# Altium schematic symbol library TI Power Management Shunt Voltage Reference.SchLib: 1526 symbols (part 7 of 18) (continued)
## REF1004C-2.5E4
designator U?
Micropower Voltage Reference, 2.5 V, 20 ppm / degC, 20 mA, 0 to 70 degC, 8-pin SOIC (D), Green (RoHS & no Sb/Br); Manufacturer: Texas Instruments; PartNumber: REF1004C-2.5E4; Iout/Iz(Max)(mA): 20; Rating: Catalog; SubFamily: Shunt Voltage Reference; VO(V): 2.5; DatasheetVersion: SBVS002; PackageVersion: 4040047-3/M; PackageReference: D8; PackageDescription: 8-Pin Plastic Small Outline, Body 4.9 x 3.9 mm, Pitch 1.27 mm; Supplier 1: Digi-Key; Supplier Part Number 1: REF1004C-2.5E4-ND; Supplier 2: Newark; Supplier Part Number 2: 28M6737; Supplier 3: Mouser; Supplier Part Number 3: 595-REF1004C-2.5E4; Eco-Plan: Green (RoHS & no Sb/Br); Min Iz for Regulation(uA): 20; Temp Coeff(Typ)(ppm/ degree C): 20; Mounting Technology: Surface Mount; Code_JEDEC: MS-012; ComponentLink1Description: Manufacturer URL; ComponentLink1URL: http://www.ti.com/; ComponentLink2Description: Datasheet; ComponentLink2URL: http://www.ti.com/lit/ds/symlink/ref1004-2.5.pdf; ComponentLink3Description: Package Specification; ComponentLink3URL: http://www.ti.com/litv/pdf/msoi002j; ComponentLink4Description: URL Link1; ComponentLink4URL: Samples URL:http://www.ti.com/product/ref1004-2.5
footprint TI-D8_N (SOIC, 8-Leads, Body 4.9x3.9mm, Pitch 1.27mm, IPC Medium Density)
part A pins: 4 ANAODE, 6 CATHODE, 8 CATHODE
part B pins: 1 NC, 2 NC, 3 NC, 5 NC, 7 NC

## REF1004I-1.2
designator U?
Micropower Voltage Reference, 1.235 V, 20 ppm / degC, 20 mA, -40 to 85 degC, 8-pin SOIC (D), Green (RoHS & no Sb/Br); Manufacturer: Texas Instruments; PartNumber: REF1004I-1.2; Initial Accuracy @ 25/deg C(%): 0.3; Iout/Iz(Max)(mA): 20; Min Iz for Regulation(uA): 10; Rating: Catalog; SubFamily: Shunt Voltage Reference; VO(V): 1.235; DatasheetVersion: SBVS002; PackageVersion: 4040047-3/M; PackageReference: D8; PackageDescription: 8-Pin Plastic Small Outline, Body 4.9 x 3.9 mm, Pitch 1.27 mm; Supplier 1: Digi-Key; Supplier Part Number 1: REF1004I-1.2-ND; Supplier 2: Newark; Supplier Part Number 2: 75C7403; Supplier 3: Mouser; Supplier Part Number 3: 595-REF1004I-1.2; Eco-Plan: Green (RoHS & no Sb/Br); Temp Coeff(Typ)(ppm/ degree C): 20; Mounting Technology: Surface Mount; Code_JEDEC: MS-012; ComponentLink1Description: Manufacturer URL; ComponentLink1URL: http://www.ti.com/; ComponentLink2Description: Datasheet; ComponentLink2URL: http://www.ti.com/general/docs/lit/getliterature.tsp?genericPartNumber=REF1004-1.2&fileType=pdf; ComponentLink3Description: Package Specification; ComponentLink3URL: http://www.ti.com/litv/pdf/msoi002j
footprint TI-D8_N (SOIC, 8-Leads, Body 4.9x3.9mm, Pitch 1.27mm, IPC Medium Density)
part A pins: 4 ANODE, 6 CATHODE, 8 CATHODE
part B pins: 1 NC, 2 NC, 3 NC, 5 NC, 7 NC

## REF1004I-1.2/2K5
designator U?
Micropower Voltage Reference, 1.235 V, 20 ppm / degC, 20 mA, -40 to 85 degC, 8-pin SOIC (D), Green (RoHS & no Sb/Br); Manufacturer: Texas Instruments; PartNumber: REF1004I-1.2/2K5; Initial Accuracy @ 25/deg C(%): 0.3; Iout/Iz(Max)(mA): 20; Min Iz for Regulation(uA): 10; Rating: Catalog; SubFamily: Shunt Voltage Reference; VO(V): 1.235; DatasheetVersion: SBVS002; PackageVersion: 4040047-3/M; PackageReference: D8; PackageDescription: 8-Pin Plastic Small Outline, Body 4.9 x 3.9 mm, Pitch 1.27 mm; Supplier 1: Digi-Key; Supplier Part Number 1: REF1004I-1.2/2K5-ND; Supplier 2: Mouser; Supplier Part Number 2: 595-REF1004I-1.2/2K5; Eco-Plan: Green (RoHS & no Sb/Br); Temp Coeff(Typ)(ppm/ degree C): 20; Mounting Technology: Surface Mount; Code_JEDEC: MS-012; ComponentLink1Description: Manufacturer URL; ComponentLink1URL: http://www.ti.com/; ComponentLink2Description: Datasheet; ComponentLink2URL: http://www.ti.com/general/docs/lit/getliterature.tsp?genericPartNumber=REF1004-1.2&fileType=pdf; ComponentLink3Description: Package Specification; ComponentLink3URL: http://www.ti.com/litv/pdf/msoi002j
footprint TI-D8_N (SOIC, 8-Leads, Body 4.9x3.9mm, Pitch 1.27mm, IPC Medium Density)
part A pins: 4 ANODE, 6 CATHODE, 8 CATHODE
part B pins: 1 NC, 2 NC, 3 NC, 5 NC, 7 NC

## REF1004I-1.2/2K5E4
designator U?
Micropower Voltage Reference, 1.235 V, 20 ppm / degC, 20 mA, -40 to 85 degC, 8-pin SOIC (D), Green (RoHS & no Sb/Br); Manufacturer: Texas Instruments; PartNumber: REF1004I-1.2/2K5E4; Initial Accuracy @ 25/deg C(%): 0.3; Iout/Iz(Max)(mA): 20; Min Iz for Regulation(uA): 10; Rating: Catalog; SubFamily: Shunt Voltage Reference; VO(V): 1.235; DatasheetVersion: SBVS002; PackageVersion: 4040047-3/M; PackageReference: D8; PackageDescription: 8-Pin Plastic Small Outline, Body 4.9 x 3.9 mm, Pitch 1.27 mm; Supplier 1: Digi-Key; Supplier Part Number 1: REF1004I-1.2/2K5E4-ND; Supplier 2: Newark; Supplier Part Number 2: 28M6738; Supplier 3: Mouser; Supplier Part Number 3: 595-REF1004I122K5E4; Eco-Plan: Green (RoHS & no Sb/Br); Temp Coeff(Typ)(ppm/ degree C): 20; Mounting Technology: Surface Mount; Code_JEDEC: MS-012; ComponentLink1Description: Manufacturer URL; ComponentLink1URL: http://www.ti.com/; ComponentLink2Description: Datasheet; ComponentLink2URL: http://www.ti.com/general/docs/lit/getliterature.tsp?genericPartNumber=REF1004-1.2&fileType=pdf; ComponentLink3Description: Package Specification; ComponentLink3URL: http://www.ti.com/litv/pdf/msoi002j
footprint TI-D8_N (SOIC, 8-Leads, Body 4.9x3.9mm, Pitch 1.27mm, IPC Medium Density)
part A pins: 4 ANODE, 6 CATHODE, 8 CATHODE
part B pins: 1 NC, 2 NC, 3 NC, 5 NC, 7 NC

## REF1004I-1.2E4
designator U?
Micropower Voltage Reference, 1.235 V, 20 ppm / degC, 20 mA, -40 to 85 degC, 8-pin SOIC (D), Green (RoHS & no Sb/Br); Manufacturer: Texas Instruments; PartNumber: REF1004I-1.2E4; Initial Accuracy @ 25/deg C(%): 0.3; Iout/Iz(Max)(mA): 20; Min Iz for Regulation(uA): 10; Rating: Catalog; SubFamily: Shunt Voltage Reference; VO(V): 1.235; DatasheetVersion: SBVS002; PackageVersion: 4040047-3/M; PackageReference: D8; PackageDescription: 8-Pin Plastic Small Outline, Body 4.9 x 3.9 mm, Pitch 1.27 mm; Supplier 1: Digi-Key; Supplier Part Number 1: REF1004I-1.2E4-ND; Supplier 2: Newark; Supplier Part Number 2: 28M6739; Supplier 3: Mouser; Supplier Part Number 3: 595-REF1004I-1.2E4; Eco-Plan: Green (RoHS & no Sb/Br); Temp Coeff(Typ)(ppm/ degree C): 20; Mounting Technology: Surface Mount; Code_JEDEC: MS-012; ComponentLink1Description: Manufacturer URL; ComponentLink1URL: http://www.ti.com/; ComponentLink2Description: Datasheet; ComponentLink2URL: http://www.ti.com/general/docs/lit/getliterature.tsp?genericPartNumber=REF1004-1.2&fileType=pdf; ComponentLink3Description: Package Specification; ComponentLink3URL: http://www.ti.com/litv/pdf/msoi002j
footprint TI-D8_N (SOIC, 8-Leads, Body 4.9x3.9mm, Pitch 1.27mm, IPC Medium Density)
part A pins: 4 ANODE, 6 CATHODE, 8 CATHODE
part B pins: 1 NC, 2 NC, 3 NC, 5 NC, 7 NC

## REF1004I-2.5
designator U?
Micropower Voltage Reference, 2.5 V, 20 ppm / degC, 20 mA, -40 to 85 degC, 8-pin SOIC (D), Green (RoHS & no Sb/Br); Manufacturer: Texas Instruments; PartNumber: REF1004I-2.5; Iout/Iz(Max)(mA): 20; Rating: Catalog; SubFamily: Shunt Voltage Reference; VO(V): 2.5; DatasheetVersion: SBVS002; PackageVersion: 4040047-3/M; PackageReference: D8; PackageDescription: 8-Pin Plastic Small Outline, Body 4.9 x 3.9 mm, Pitch 1.27 mm; Supplier 1: Digi-Key; Supplier Part Number 1: REF1004I-2.5-ND; Supplier 2: Farnell; Supplier Part Number 2: 1459245; Supplier 3: Newark; Supplier Part Number 3: 61M8496; Supplier 4: Newark; Supplier Part Number 4: 75C7405; Supplier 5: Mouser; Supplier Part Number 5: 595-REF1004I-2.5; Eco-Plan: Green (RoHS & no Sb/Br); Min Iz for Regulation(uA): 20; Temp Coeff(Typ)(ppm/ degree C): 20; Mounting Technology: Surface Mount; Code_JEDEC: MS-012; ComponentLink1Description: Manufacturer URL; ComponentLink1URL: http://www.ti.com/; ComponentLink2Description: Datasheet; ComponentLink2URL: http://www.ti.com/lit/ds/symlink/ref1004-2.5.pdf; ComponentLink3Description: Package Specification; ComponentLink3URL: http://www.ti.com/litv/pdf/msoi002j; ComponentLink4Description: URL Link1; ComponentLink4URL: Samples URL:http://www.ti.com/product/ref1004-2.5
footprint TI-D8_N (SOIC, 8-Leads, Body 4.9x3.9mm, Pitch 1.27mm, IPC Medium Density)
part A pins: 4 ANAODE, 6 CATHODE, 8 CATHODE
part B pins: 1 NC, 2 NC, 3 NC, 5 NC, 7 NC

## REF1004I-2.5/2K5
designator U?
Micropower Voltage Reference, 2.5 V, 20 ppm / degC, 20 mA, -40 to 85 degC, 8-pin SOIC (D), Green (RoHS & no Sb/Br); Manufacturer: Texas Instruments; PartNumber: REF1004I-2.5/2K5; Iout/Iz(Max)(mA): 20; Rating: Catalog; SubFamily: Shunt Voltage Reference; VO(V): 2.5; DatasheetVersion: SBVS002; PackageVersion: 4040047-3/M; PackageReference: D8; PackageDescription: 8-Pin Plastic Small Outline, Body 4.9 x 3.9 mm, Pitch 1.27 mm; Supplier 1: Digi-Key; Supplier Part Number 1: REF1004I-2.5/2K5-ND; Supplier 2: Mouser; Supplier Part Number 2: 595-REF1004I-2.5/2K5; Eco-Plan: Green (RoHS & no Sb/Br); Min Iz for Regulation(uA): 20; Temp Coeff(Typ)(ppm/ degree C): 20; Mounting Technology: Surface Mount; Code_JEDEC: MS-012; ComponentLink1Description: Manufacturer URL; ComponentLink1URL: http://www.ti.com/; ComponentLink2Description: Datasheet; ComponentLink2URL: http://www.ti.com/lit/ds/symlink/ref1004-2.5.pdf; ComponentLink3Description: Package Specification; ComponentLink3URL: http://www.ti.com/litv/pdf/msoi002j; ComponentLink4Description: URL Link1; ComponentLink4URL: Samples URL:http://www.ti.com/product/ref1004-2.5
footprint TI-D8_N (SOIC, 8-Leads, Body 4.9x3.9mm, Pitch 1.27mm, IPC Medium Density)
part A pins: 4 ANAODE, 6 CATHODE, 8 CATHODE
part B pins: 1 NC, 2 NC, 3 NC, 5 NC, 7 NC

## REF1004I-2.5/2K5E4
designator U?
Micropower Voltage Reference, 2.5 V, 20 ppm / degC, 20 mA, -40 to 85 degC, 8-pin SOIC (D), Green (RoHS & no Sb/Br); Manufacturer: Texas Instruments; PartNumber: REF1004I-2.5/2K5E4; Iout/Iz(Max)(mA): 20; Rating: Catalog; SubFamily: Shunt Voltage Reference; VO(V): 2.5; DatasheetVersion: SBVS002; PackageVersion: 4040047-3/M; PackageReference: D8; PackageDescription: 8-Pin Plastic Small Outline, Body 4.9 x 3.9 mm, Pitch 1.27 mm; Supplier 1: Digi-Key; Supplier Part Number 1: REF1004I-2.5/2K5E4-ND; Supplier 2: Newark; Supplier Part Number 2: 28M6740; Supplier 3: Mouser; Supplier Part Number 3: 595-REF1004I252K5E4; Eco-Plan: Green (RoHS & no Sb/Br); Min Iz for Regulation(uA): 20; Temp Coeff(Typ)(ppm/ degree C): 20; Mounting Technology: Surface Mount; Code_JEDEC: MS-012; ComponentLink1Description: Manufacturer URL; ComponentLink1URL: http://www.ti.com/; ComponentLink2Description: Datasheet; ComponentLink2URL: http://www.ti.com/lit/ds/symlink/ref1004-2.5.pdf; ComponentLink3Description: Package Specification; ComponentLink3URL: http://www.ti.com/litv/pdf/msoi002j; ComponentLink4Description: URL Link1; ComponentLink4URL: Samples URL:http://www.ti.com/product/ref1004-2.5
footprint TI-D8_N (SOIC, 8-Leads, Body 4.9x3.9mm, Pitch 1.27mm, IPC Medium Density)
part A pins: 4 ANAODE, 6 CATHODE, 8 CATHODE
part B pins: 1 NC, 2 NC, 3 NC, 5 NC, 7 NC

## REF1004I-2.5E4
designator U?
Micropower Voltage Reference, 2.5 V, 20 ppm / degC, 20 mA, -40 to 85 degC, 8-pin SOIC (D), Green (RoHS & no Sb/Br); Manufacturer: Texas Instruments; PartNumber: REF1004I-2.5E4; Initial Accuracy @ 25/deg C(%): 0.4; Iout/Iz(Max)(mA): 20; Rating: Catalog; SubFamily: Shunt Voltage Reference; VO(V): 2.5; DatasheetVersion: SBVS002; PackageVersion: 4040047-3/M; PackageReference: D8; PackageDescription: 8-Pin Plastic Small Outline, Body 4.9 x 3.9 mm, Pitch 1.27 mm; Supplier 1: Digi-Key; Supplier Part Number 1: REF1004I-2.5E4-ND; Supplier 2: Newark; Supplier Part Number 2: 28M6741; Supplier 3: Mouser; Supplier Part Number 3: 595-REF1004I-2.5E4; Eco-Plan: Green (RoHS & no Sb/Br); Min Iz for Regulation(uA): 20; Temp Coeff(Typ)(ppm/ degree C): 20; Mounting Technology: Surface Mount; Code_JEDEC: MS-012; ComponentLink1Description: Manufacturer URL; ComponentLink1URL: http://www.ti.com/; ComponentLink2Description: Datasheet; ComponentLink2URL: http://www.ti.com/lit/ds/symlink/ref1004-2.5.pdf; ComponentLink3Description: Package Specification; ComponentLink3URL: http://www.ti.com/litv/pdf/msoi002j
footprint TI-D8_N (SOIC, 8-Leads, Body 4.9x3.9mm, Pitch 1.27mm, IPC Medium Density)
part A pins: 4 ANAODE, 6 CATHODE, 8 CATHODE
part B pins: 1 NC, 2 NC, 3 NC, 5 NC, 7 NC

## REF1112AIDBZR
designator U?
1 uA Shunt Voltage Reference, 1.25 V, 10 ppm / degC, 5 mA, -40 to 85 degC, 3-pin SOT-23 (DBZ), Green (RoHS & no Sb/Br); Manufacturer: Texas Instruments; PartNumber: REF1112AIDBZR; Initial Accuracy @ 25/deg C(%): 0.2; Iout/Iz(Max)(mA): 5; Min Iz for Regulation(uA): 1.2; Rating: Catalog; Temp Coeff(Max)(ppm/ degree C): 50; Temp Coeff(Typ)(ppm/ degree C): 10; VO(V): 1.25; DatasheetVersion: SBOS283C; PackageVersion: 4203227/B; PackageReference: DBZ3; PackageDescription: 3-Pin Plastic Small Outline, Body 2.92 x 1.3 mm, Pitch 0.95 mm; Supplier 1: Digi-Key; Supplier Part Number 1: REF1112AIDBZR-ND; Supplier 2: Newark; Supplier Part Number 2: 87H2545; Supplier 3: Mouser; Supplier Part Number 3: 595-REF1112AIDBZR; Eco-Plan: Green (RoHS & no Sb/Br); SubFamily: Shunt Voltage Reference; Mounting Technology: Surface Mount; Code_JEDEC: TO-236; ComponentLink1Description: Manufacturer URL; ComponentLink1URL: http://www.ti.com/; ComponentLink2Description: Datasheet; ComponentLink2URL: http://www.ti.com/general/docs/lit/getliterature.tsp?genericPartNumber=REF1112&fileType=pdf; ComponentLink3Description: Package Specification; ComponentLink3URL: http://www.ti.com/litv/pdf/mpds108a; ComponentLink4Description: URL Link1; ComponentLink4URL: Samples URL:http://www.ti.com/product/ref1112
footprint TI-DBZ3_N (SOT23, 3-Leads, Body 2.92x1.3 mm, Pitch 0.95 mm, IPC Medium Density)
pins: 1 VO, 2 GND (power), 3 NC

## REF1112AIDBZRG4
designator U?
1 uA Shunt Voltage Reference, 1.25 V, 10 ppm / degC, 5 mA, -40 to 85 degC, 3-pin SOT-23 (DBZ), Green (RoHS & no Sb/Br); Manufacturer: Texas Instruments; PartNumber: REF1112AIDBZRG4; Initial Accuracy @ 25/deg C(%): 0.2; Iout/Iz(Max)(mA): 5; Min Iz for Regulation(uA): 1.2; Rating: Catalog; Temp Coeff(Max)(ppm/ degree C): 50; Temp Coeff(Typ)(ppm/ degree C): 10; VO(V): 1.25; DatasheetVersion: SBOS283C; PackageVersion: 4203227/B; PackageReference: DBZ3; PackageDescription: 3-Pin Plastic Small Outline, Body 2.92 x 1.3 mm, Pitch 0.95 mm; Supplier 1: Digi-Key; Supplier Part Number 1: REF1112AIDBZRG4-ND; Supplier 2: Newark; Supplier Part Number 2: 67K8284; Supplier 3: Mouser; Supplier Part Number 3: 595-REF1112AIDBZRG4; Eco-Plan: Green (RoHS & no Sb/Br); SubFamily: Shunt Voltage Reference; Mounting Technology: Surface Mount; Code_JEDEC: TO-236; ComponentLink1Description: Manufacturer URL; ComponentLink1URL: http://www.ti.com/; ComponentLink2Description: Datasheet; ComponentLink2URL: http://www.ti.com/general/docs/lit/getliterature.tsp?genericPartNumber=REF1112&fileType=pdf; ComponentLink3Description: Package Specification; ComponentLink3URL: http://www.ti.com/litv/pdf/mpds108a; ComponentLink4Description: URL Link1; ComponentLink4URL: Samples URL:http://www.ti.com/product/ref1112
footprint TI-DBZ3_N (SOT23, 3-Leads, Body 2.92x1.3 mm, Pitch 0.95 mm, IPC Medium Density)
pins: 1 VO, 2 GND (power), 3 NC

## REF1112AIDBZT
designator U?
1 uA Shunt Voltage Reference, 1.25 V, 10 ppm / degC, 5 mA, -40 to 85 degC, 3-pin SOT-23 (DBZ), Green (RoHS & no Sb/Br); Manufacturer: Texas Instruments; PartNumber: REF1112AIDBZT; Initial Accuracy @ 25/deg C(%): 0.2; Iout/Iz(Max)(mA): 5; Min Iz for Regulation(uA): 1.2; Rating: Catalog; Temp Coeff(Max)(ppm/ degree C): 50; Temp Coeff(Typ)(ppm/ degree C): 10; VO(V): 1.25; DatasheetVersion: SBOS283C; PackageVersion: 4203227/B; PackageReference: DBZ3; PackageDescription: 3-Pin Plastic Small Outline, Body 2.92 x 1.3 mm, Pitch 0.95 mm; Supplier 1: Digi-Key; Supplier Part Number 1: 296-15842-2-ND; Supplier 2: Digi-Key; Supplier Part Number 2: 296-15842-1-ND; Supplier 3: Digi-Key; Supplier Part Number 3: 296-15842-6-ND; Supplier 4: Newark; Supplier Part Number 4: 84H1139; Supplier 5: Mouser; Supplier Part Number 5: 595-REF1112AIDBZT; Eco-Plan: Green (RoHS & no Sb/Br); SubFamily: Shunt Voltage Reference; Mounting Technology: Surface Mount; Code_JEDEC: TO-236; ComponentLink1Description: Manufacturer URL; ComponentLink1URL: http://www.ti.com/; ComponentLink2Description: Datasheet; ComponentLink2URL: http://www.ti.com/general/docs/lit/getliterature.tsp?genericPartNumber=REF1112&fileType=pdf; ComponentLink3Description: Package Specification; ComponentLink3URL: http://www.ti.com/litv/pdf/mpds108a; ComponentLink4Description: URL Link1; ComponentLink4URL: Samples URL:http://www.ti.com/product/ref1112
footprint TI-DBZ3_N (SOT23, 3-Leads, Body 2.92x1.3 mm, Pitch 0.95 mm, IPC Medium Density)
pins: 1 VO, 2 GND (power), 3 NC

## REF1112AIDBZTG4
designator U?
1 uA Shunt Voltage Reference, 1.25 V, 10 ppm / degC, 5 mA, -40 to 85 degC, 3-pin SOT-23 (DBZ), Green (RoHS & no Sb/Br); Manufacturer: Texas Instruments; PartNumber: REF1112AIDBZTG4; Initial Accuracy @ 25/deg C(%): 0.2; Iout/Iz(Max)(mA): 5; Min Iz for Regulation(uA): 1.2; Rating: Catalog; Temp Coeff(Max)(ppm/ degree C): 50; Temp Coeff(Typ)(ppm/ degree C): 10; VO(V): 1.25; DatasheetVersion: SBOS283C; PackageVersion: 4203227/B; PackageReference: DBZ3; PackageDescription: 3-Pin Plastic Small Outline, Body 2.92 x 1.3 mm, Pitch 0.95 mm; Supplier 1: Digi-Key; Supplier Part Number 1: REF1112AIDBZTG4-ND; Supplier 2: Mouser; Supplier Part Number 2: 595-REF1112AIDBZTG4; Eco-Plan: Green (RoHS & no Sb/Br); SubFamily: Shunt Voltage Reference; Mounting Technology: Surface Mount; Code_JEDEC: TO-236; ComponentLink1Description: Manufacturer URL; ComponentLink1URL: http://www.ti.com/; ComponentLink2Description: Datasheet; ComponentLink2URL: http://www.ti.com/general/docs/lit/getliterature.tsp?genericPartNumber=REF1112&fileType=pdf; ComponentLink3Description: Package Specification; ComponentLink3URL: http://www.ti.com/litv/pdf/mpds108a; ComponentLink4Description: URL Link1; ComponentLink4URL: Samples URL:http://www.ti.com/product/ref1112
footprint TI-DBZ3_N (SOT23, 3-Leads, Body 2.92x1.3 mm, Pitch 0.95 mm, IPC Medium Density)
pins: 1 VO, 2 GND (power), 3 NC

## TL430CLP
designator U?
Adjustable Shunt Regulator, 120 ppm / degC, 100 mA, 0 to 70 degC, 3-pin TO-92 (LP), Pb-Free (RoHS); Manufacturer: Texas Instruments; PartNumber: TL430CLP; Iout/Iz(Max)(mA): 100; Min Iz for Regulation(uA): 2000; Rating: Catalog; SubFamily: Shunt Voltage Reference; Temp Coeff(Max)(ppm/ degree C): 200; Temp Coeff(Typ)(ppm/ degree C): 120; VO Adj(Max)(V): 30; VO Adj(Min)(V): 2.75; DatasheetVersion: SLVS050D; PackageVersion: 4040001-2/C; PackageReference: LP3; PackageDescription: Plastic Cylindrical Package, Formed Lead Option (TO-92); Supplier 1: Digi-Key; Supplier Part Number 1: 296-10181-5-ND; Supplier 2: Farnell; Supplier Part Number 2: 1690616; Supplier 3: Newark; Supplier Part Number 3: 14P7543; Supplier 4: Mouser; Supplier Part Number 4: 595-TL430CLP; Eco-Plan: Pb-Free (RoHS); Mounting Technology: Through Hole; Code_JEDEC: TO-226; ComponentLink1Description: Manufacturer URL; ComponentLink1URL: http://www.ti.com/; ComponentLink2Description: Datasheet; ComponentLink2URL: http://www.ti.com/general/docs/lit/getliterature.tsp?genericPartNumber=TL430&fileType=pdf; ComponentLink3Description: Package Specification; ComponentLink3URL: http://www.ti.com/litv/pdf/msot002a
footprint TI-LP3 (TO, Flat Index; 3 In-Line, Formed Axial Leads; Body Dia. 4.8mm; Leads 0.56 x 0.41 mm (max))
pins: 1 REF (in), 2 ANODE, 3 CATHODE

## TL430CLPE3
designator U?
Adjustable Shunt Regulator, 120 ppm / degC, 100 mA, 0 to 70 degC, 3-pin TO-92 (LP), Pb-Free (RoHS); Manufacturer: Texas Instruments; PartNumber: TL430CLPE3; Iout/Iz(Max)(mA): 100; Min Iz for Regulation(uA): 2000; Rating: Catalog; SubFamily: Shunt Voltage Reference; Temp Coeff(Max)(ppm/ degree C): 200; Temp Coeff(Typ)(ppm/ degree C): 120; VO Adj(Max)(V): 30; VO Adj(Min)(V): 2.75; DatasheetVersion: SLVS050D; PackageVersion: 4040001-2/C; PackageReference: LP3; PackageDescription: Plastic Cylindrical Package, Formed Lead Option (TO-92); Supplier 1: Digi-Key; Supplier Part Number 1: TL430CLPE3-ND; Supplier 2: Newark; Supplier Part Number 2: 66K4467; Supplier 3: Mouser; Supplier Part Number 3: 595-TL430CLPE3; Eco-Plan: Pb-Free (RoHS); Mounting Technology: Through Hole; Code_JEDEC: TO-226; ComponentLink1Description: Manufacturer URL; ComponentLink1URL: http://www.ti.com/; ComponentLink2Description: Datasheet; ComponentLink2URL: http://www.ti.com/general/docs/lit/getliterature.tsp?genericPartNumber=TL430&fileType=pdf; ComponentLink3Description: Package Specification; ComponentLink3URL: http://www.ti.com/litv/pdf/msot002a
footprint TI-LP3 (TO, Flat Index; 3 In-Line, Formed Axial Leads; Body Dia. 4.8mm; Leads 0.56 x 0.41 mm (max))
pins: 1 REF (in), 2 ANODE, 3 CATHODE

## TL430CLPR
designator U?
Adjustable Shunt Regulator, 120 ppm / degC, 100 mA, 0 to 70 degC, 3-pin TO-92 (LP), Pb-Free (RoHS); Manufacturer: Texas Instruments; PartNumber: TL430CLPR; Iout/Iz(Max)(mA): 100; Min Iz for Regulation(uA): 2000; Rating: Catalog; SubFamily: Shunt Voltage Reference; Temp Coeff(Max)(ppm/ degree C): 200; Temp Coeff(Typ)(ppm/ degree C): 120; VO Adj(Max)(V): 30; VO Adj(Min)(V): 2.75; DatasheetVersion: SLVS050D; PackageVersion: 4040001-2/C; PackageReference: LP3; PackageDescription: Plastic Cylindrical Package, Formed Lead Option (TO-92); Supplier 1: Digi-Key; Supplier Part Number 1: TL430CLPR-ND; Supplier 2: Mouser; Supplier Part Number 2: 595-TL430CLPR; Eco-Plan: Pb-Free (RoHS); Mounting Technology: Through Hole; Code_JEDEC: TO-226; ComponentLink1Description: Manufacturer URL; ComponentLink1URL: http://www.ti.com/; ComponentLink2Description: Datasheet; ComponentLink2URL: http://www.ti.com/general/docs/lit/getliterature.tsp?genericPartNumber=TL430&fileType=pdf; ComponentLink3Description: Package Specification; ComponentLink3URL: http://www.ti.com/litv/pdf/msot002a
footprint TI-LP3 (TO, Flat Index; 3 In-Line, Formed Axial Leads; Body Dia. 4.8mm; Leads 0.56 x 0.41 mm (max))
pins: 1 REF (in), 2 ANODE, 3 CATHODE

## TL430CLPRE3
designator U?
Adjustable Shunt Regulator, 120 ppm / degC, 100 mA, 0 to 70 degC, 3-pin TO-92 (LP), Pb-Free (RoHS); Manufacturer: Texas Instruments; PartNumber: TL430CLPRE3; Iout/Iz(Max)(mA): 100; Min Iz for Regulation(uA): 2000; Rating: Catalog; SubFamily: Shunt Voltage Reference; Temp Coeff(Max)(ppm/ degree C): 200; Temp Coeff(Typ)(ppm/ degree C): 120; VO Adj(Max)(V): 30; VO Adj(Min)(V): 2.75; DatasheetVersion: SLVS050D; PackageVersion: 4040001-2/C; PackageReference: LP3; PackageDescription: Plastic Cylindrical Package, Formed Lead Option (TO-92); Supplier 1: Digi-Key; Supplier Part Number 1: TL430CLPRE3-ND; Supplier 2: Mouser; Supplier Part Number 2: 595-TL430CLPRE3; Eco-Plan: Pb-Free (RoHS); Mounting Technology: Through Hole; Code_JEDEC: TO-226; ComponentLink1Description: Manufacturer URL; ComponentLink1URL: http://www.ti.com/; ComponentLink2Description: Datasheet; ComponentLink2URL: http://www.ti.com/general/docs/lit/getliterature.tsp?genericPartNumber=TL430&fileType=pdf; ComponentLink3Description: Package Specification; ComponentLink3URL: http://www.ti.com/litv/pdf/msot002a
footprint TI-LP3 (TO, Flat Index; 3 In-Line, Formed Axial Leads; Body Dia. 4.8mm; Leads 0.56 x 0.41 mm (max))
pins: 1 REF (in), 2 ANODE, 3 CATHODE

## TL431ACD
designator U?
Adjustable Precision Shunt Regulator, 34 ppm / degC, 100 mA, 0 to 70 degC, 8-pin SOIC (D), Green (RoHS & no Sb/Br); Manufacturer: Texas Instruments; PartNumber: TL431ACD; Iout/Iz(Max)(mA): 100; Min Iz for Regulation(uA): 600; Rating: Catalog; SubFamily: Shunt Voltage Reference; Temp Coeff(Max)(ppm/ degree C): 92; Temp Coeff(Typ)(ppm/ degree C): 34; VO Adj(Max)(V): 36; VO Adj(Min)(V): 2.495; DatasheetVersion: SLVS543M; PackageVersion: 4040047-3/M; PackageReference: D8; PackageDescription: 8-Pin Plastic Small Outline, Body 4.9 x 3.9 mm, Pitch 1.27 mm; Supplier 1: Digi-Key; Supplier Part Number 1: 296-1286-5-ND; Supplier 2: Farnell; Supplier Part Number 2: 9593535; Supplier 3: Newark; Supplier Part Number 3: 67K2879; Supplier 4: Mouser; Supplier Part Number 4: 595-TL431ACD; Eco-Plan: Green (RoHS & no Sb/Br); Mounting Technology: Surface Mount; Code_JEDEC: MS-012; ComponentLink1Description: Manufacturer URL; ComponentLink1URL: http://www.ti.com/; ComponentLink2Description: Datasheet; ComponentLink2URL: http://www.ti.com/general/docs/lit/getliterature.tsp?genericPartNumber=TL431A&fileType=pdf; ComponentLink3Description: Package Specification; ComponentLink3URL: http://www.ti.com/litv/pdf/msoi002j
footprint TI-D8_N (SOIC, 8-Leads, Body 4.9x3.9mm, Pitch 1.27mm, IPC Medium Density)
part A pins: 1 CATHODE, 2 ANODE, 3 ANAODE, 6 ANODE, 7 ANODE, 8 REF (in)
part B pins: 4 NC, 5 NC

## TL431ACDBVR
designator U?
Adjustable Precision Shunt Regulator, 34 ppm / degC, 100 mA, 0 to 70 degC, 5-pin SOT-23 (DBV), Green (RoHS & no Sb/Br); Manufacturer: Texas Instruments; PartNumber: TL431ACDBVR; Iout/Iz(Max)(mA): 100; Min Iz for Regulation(uA): 600; Rating: Catalog; SubFamily: Shunt Voltage Reference; Temp Coeff(Max)(ppm/ degree C): 92; Temp Coeff(Typ)(ppm/ degree C): 34; VO Adj(Max)(V): 36; VO Adj(Min)(V): 2.495; DatasheetVersion: SLVS543M; PackageVersion: 4073253-4/K; PackageReference: DBV5; PackageDescription: 5-Pin Plastic Small Outline, Body 1.60 ?2.90 mm, Pitch 0.95 mm; Supplier 1: Digi-Key; Supplier Part Number 1: 296-15236-2-ND; Supplier 2: Digi-Key; Supplier Part Number 2: 296-15236-1-ND; Supplier 3: Digi-Key; Supplier Part Number 3: 296-15236-6-ND; Supplier 4: Newark; Supplier Part Number 4: 67K2880; Supplier 5: Mouser; Supplier Part Number 5: 595-TL431ACDBVR; Eco-Plan: Green (RoHS & no Sb/Br); Mounting Technology: Surface Mount; Code_JEDEC: MO-178; ComponentLink1Description: Manufacturer URL; ComponentLink1URL: http://www.ti.com/; ComponentLink2Description: Datasheet; ComponentLink2URL: http://www.ti.com/general/docs/lit/getliterature.tsp?genericPartNumber=TL431A&fileType=pdf; ComponentLink3Description: Package Specification; ComponentLink3URL: http://www.ti.com/litv/pdf/mpds018i
footprint TI-DBV5_N (SOT23, 5-Leads, Body 2.9x1.6mm, Pitch 0.95mm, IPC Medium Density)
part A pins: 3 CATHODE, 4 REF (in), 5 ANODE
part B pins: 1 NC, 2 NC

## TL431ACDBVRE4
designator U?
Adjustable Precision Shunt Regulator, 34 ppm / degC, 100 mA, 0 to 70 degC, 5-pin SOT-23 (DBV), Green (RoHS & no Sb/Br); Manufacturer: Texas Instruments; PartNumber: TL431ACDBVRE4; Iout/Iz(Max)(mA): 100; Min Iz for Regulation(uA): 600; Rating: Catalog; SubFamily: Shunt Voltage Reference; Temp Coeff(Max)(ppm/ degree C): 92; Temp Coeff(Typ)(ppm/ degree C): 34; VO Adj(Max)(V): 36; VO Adj(Min)(V): 2.495; DatasheetVersion: SLVS543M; PackageVersion: 4073253-4/K; PackageReference: DBV5; PackageDescription: 5-Pin Plastic Small Outline, Body 1.60 ?2.90 mm, Pitch 0.95 mm; Supplier 1: Digi-Key; Supplier Part Number 1: TL431ACDBVRE4-ND; Supplier 2: Mouser; Supplier Part Number 2: 595-TL431ACDBVRE4; Eco-Plan: Green (RoHS & no Sb/Br); Mounting Technology: Surface Mount; Code_JEDEC: MO-178; ComponentLink1Description: Manufacturer URL; ComponentLink1URL: http://www.ti.com/; ComponentLink2Description: Datasheet; ComponentLink2URL: http://www.ti.com/general/docs/lit/getliterature.tsp?genericPartNumber=TL431A&fileType=pdf; ComponentLink3Description: Package Specification; ComponentLink3URL: http://www.ti.com/litv/pdf/mpds018i
footprint TI-DBV5_N (SOT23, 5-Leads, Body 2.9x1.6mm, Pitch 0.95mm, IPC Medium Density)
part A pins: 3 CATHODE, 4 REF (in), 5 ANODE
part B pins: 1 NC, 2 NC

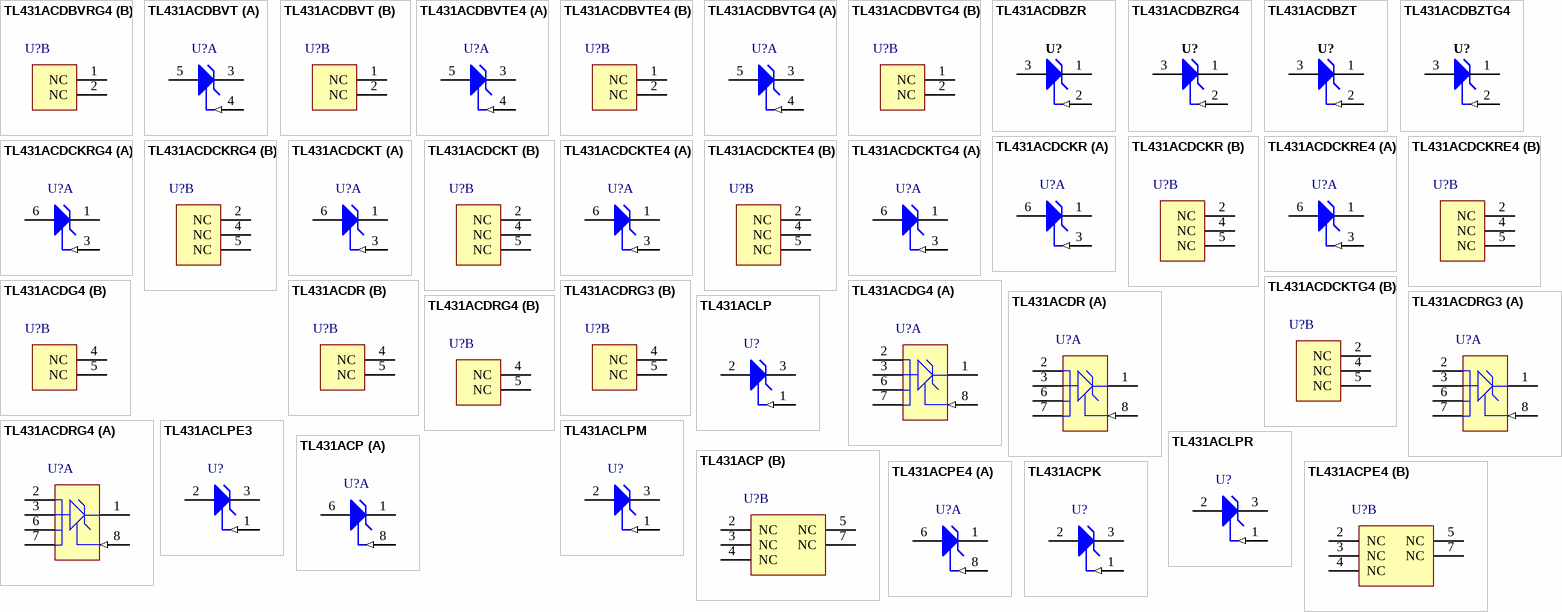
[diagram p22: symbols TL431ACDBVRG4 to TL431ACPK]

## TL431ACDBVRG4
designator U?
Adjustable Precision Shunt Regulator, 34 ppm / degC, 100 mA, 0 to 70 degC, 5-pin SOT-23 (DBV), Green (RoHS & no Sb/Br); Manufacturer: Texas Instruments; PartNumber: TL431ACDBVRG4; Iout/Iz(Max)(mA): 100; Min Iz for Regulation(uA): 600; Rating: Catalog; SubFamily: Shunt Voltage Reference; Temp Coeff(Max)(ppm/ degree C): 92; Temp Coeff(Typ)(ppm/ degree C): 34; VO Adj(Max)(V): 36; VO Adj(Min)(V): 2.495; DatasheetVersion: SLVS543M; PackageVersion: 4073253-4/K; PackageReference: DBV5; PackageDescription: 5-Pin Plastic Small Outline, Body 1.60 ?2.90 mm, Pitch 0.95 mm; Supplier 1: Digi-Key; Supplier Part Number 1: TL431ACDBVRG4-ND; Supplier 2: Farnell; Supplier Part Number 2: 1053481; Supplier 3: Mouser; Supplier Part Number 3: 595-TL431ACDBVRG4; Eco-Plan: Green (RoHS & no Sb/Br); Mounting Technology: Surface Mount; Code_JEDEC: MO-178; ComponentLink1Description: Manufacturer URL; ComponentLink1URL: http://www.ti.com/; ComponentLink2Description: Datasheet; ComponentLink2URL: http://www.ti.com/general/docs/lit/getliterature.tsp?genericPartNumber=TL431A&fileType=pdf; ComponentLink3Description: Package Specification; ComponentLink3URL: http://www.ti.com/litv/pdf/mpds018i
footprint TI-DBV5_N (SOT23, 5-Leads, Body 2.9x1.6mm, Pitch 0.95mm, IPC Medium Density)
part A pins: 3 CATHODE, 4 REF (in), 5 ANODE
part B pins: 1 NC, 2 NC

## TL431ACDBVT
designator U?
Adjustable Precision Shunt Regulator, 34 ppm / degC, 100 mA, 0 to 70 degC, 5-pin SOT-23 (DBV), Green (RoHS & no Sb/Br); Manufacturer: Texas Instruments; PartNumber: TL431ACDBVT; Iout/Iz(Max)(mA): 100; Min Iz for Regulation(uA): 600; Rating: Catalog; SubFamily: Shunt Voltage Reference; Temp Coeff(Max)(ppm/ degree C): 92; Temp Coeff(Typ)(ppm/ degree C): 34; VO Adj(Max)(V): 36; VO Adj(Min)(V): 2.495; DatasheetVersion: SLVS543M; PackageVersion: 4073253-4/K; PackageReference: DBV5; PackageDescription: 5-Pin Plastic Small Outline, Body 1.60 ?2.90 mm, Pitch 0.95 mm; Supplier 1: Digi-Key; Supplier Part Number 1: 296-15323-2-ND; Supplier 2: Digi-Key; Supplier Part Number 2: 296-15323-1-ND; Supplier 3: Digi-Key; Supplier Part Number 3: 296-15323-6-ND; Supplier 4: Newark; Supplier Part Number 4: 67H1756; Supplier 5: Mouser; Supplier Part Number 5: 595-TL431ACDBVT; Eco-Plan: Green (RoHS & no Sb/Br); Mounting Technology: Surface Mount; Code_JEDEC: MO-178; ComponentLink1Description: Manufacturer URL; ComponentLink1URL: http://www.ti.com/; ComponentLink2Description: Datasheet; ComponentLink2URL: http://www.ti.com/general/docs/lit/getliterature.tsp?genericPartNumber=TL431A&fileType=pdf; ComponentLink3Description: Package Specification; ComponentLink3URL: http://www.ti.com/litv/pdf/mpds018i
footprint TI-DBV5_N (SOT23, 5-Leads, Body 2.9x1.6mm, Pitch 0.95mm, IPC Medium Density)
part A pins: 3 CATHODE, 4 REF (in), 5 ANODE
part B pins: 1 NC, 2 NC

## TL431ACDBVTE4
designator U?
Adjustable Precision Shunt Regulator, 34 ppm / degC, 100 mA, 0 to 70 degC, 5-pin SOT-23 (DBV), Green (RoHS & no Sb/Br); Manufacturer: Texas Instruments; PartNumber: TL431ACDBVTE4; Iout/Iz(Max)(mA): 100; Min Iz for Regulation(uA): 600; Rating: Catalog; SubFamily: Shunt Voltage Reference; Temp Coeff(Max)(ppm/ degree C): 92; Temp Coeff(Typ)(ppm/ degree C): 34; VO Adj(Max)(V): 36; VO Adj(Min)(V): 2.495; DatasheetVersion: SLVS543M; PackageVersion: 4073253-4/K; PackageReference: DBV5; PackageDescription: 5-Pin Plastic Small Outline, Body 1.60 ?2.90 mm, Pitch 0.95 mm; Supplier 1: Digi-Key; Supplier Part Number 1: TL431ACDBVTE4-ND; Supplier 2: Mouser; Supplier Part Number 2: 595-TL431ACDBVTE4; Eco-Plan: Green (RoHS & no Sb/Br); Mounting Technology: Surface Mount; Code_JEDEC: MO-178; ComponentLink1Description: Manufacturer URL; ComponentLink1URL: http://www.ti.com/; ComponentLink2Description: Datasheet; ComponentLink2URL: http://www.ti.com/general/docs/lit/getliterature.tsp?genericPartNumber=TL431A&fileType=pdf; ComponentLink3Description: Package Specification; ComponentLink3URL: http://www.ti.com/litv/pdf/mpds018i
footprint TI-DBV5_N (SOT23, 5-Leads, Body 2.9x1.6mm, Pitch 0.95mm, IPC Medium Density)
part A pins: 3 CATHODE, 4 REF (in), 5 ANODE
part B pins: 1 NC, 2 NC

## TL431ACDBVTG4
designator U?
Adjustable Precision Shunt Regulator, 34 ppm / degC, 100 mA, 0 to 70 degC, 5-pin SOT-23 (DBV), Green (RoHS & no Sb/Br); Manufacturer: Texas Instruments; PartNumber: TL431ACDBVTG4; Iout/Iz(Max)(mA): 100; Min Iz for Regulation(uA): 600; Rating: Catalog; SubFamily: Shunt Voltage Reference; Temp Coeff(Max)(ppm/ degree C): 92; Temp Coeff(Typ)(ppm/ degree C): 34; VO Adj(Max)(V): 36; VO Adj(Min)(V): 2.495; DatasheetVersion: SLVS543M; PackageVersion: 4073253-4/K; PackageReference: DBV5; PackageDescription: 5-Pin Plastic Small Outline, Body 1.60 ?2.90 mm, Pitch 0.95 mm; Supplier 1: Digi-Key; Supplier Part Number 1: TL431ACDBVTG4-ND; Supplier 2: Newark; Supplier Part Number 2: 46M9244; Supplier 3: Mouser; Supplier Part Number 3: 595-TL431ACDBVTG4; Eco-Plan: Green (RoHS & no Sb/Br); Mounting Technology: Surface Mount; Code_JEDEC: MO-178; ComponentLink1Description: Manufacturer URL; ComponentLink1URL: http://www.ti.com/; ComponentLink2Description: Datasheet; ComponentLink2URL: http://www.ti.com/general/docs/lit/getliterature.tsp?genericPartNumber=TL431A&fileType=pdf; ComponentLink3Description: Package Specification; ComponentLink3URL: http://www.ti.com/litv/pdf/mpds018i
footprint TI-DBV5_N (SOT23, 5-Leads, Body 2.9x1.6mm, Pitch 0.95mm, IPC Medium Density)
part A pins: 3 CATHODE, 4 REF (in), 5 ANODE
part B pins: 1 NC, 2 NC